# Altium footprint library UWRT Footprint Library.PcbLib: 258 footprints (part 13 of 17)
Each footprint in its own frame and in the unit in brackets; x right, y up, seen from the top. Pads: shape width x height; smd on the part's side, far side on the other; paste and mask are expansions set on the pad; w line width, h text height; cw(c..) or ccw(c..) is an arc to the next point about the centre after c.
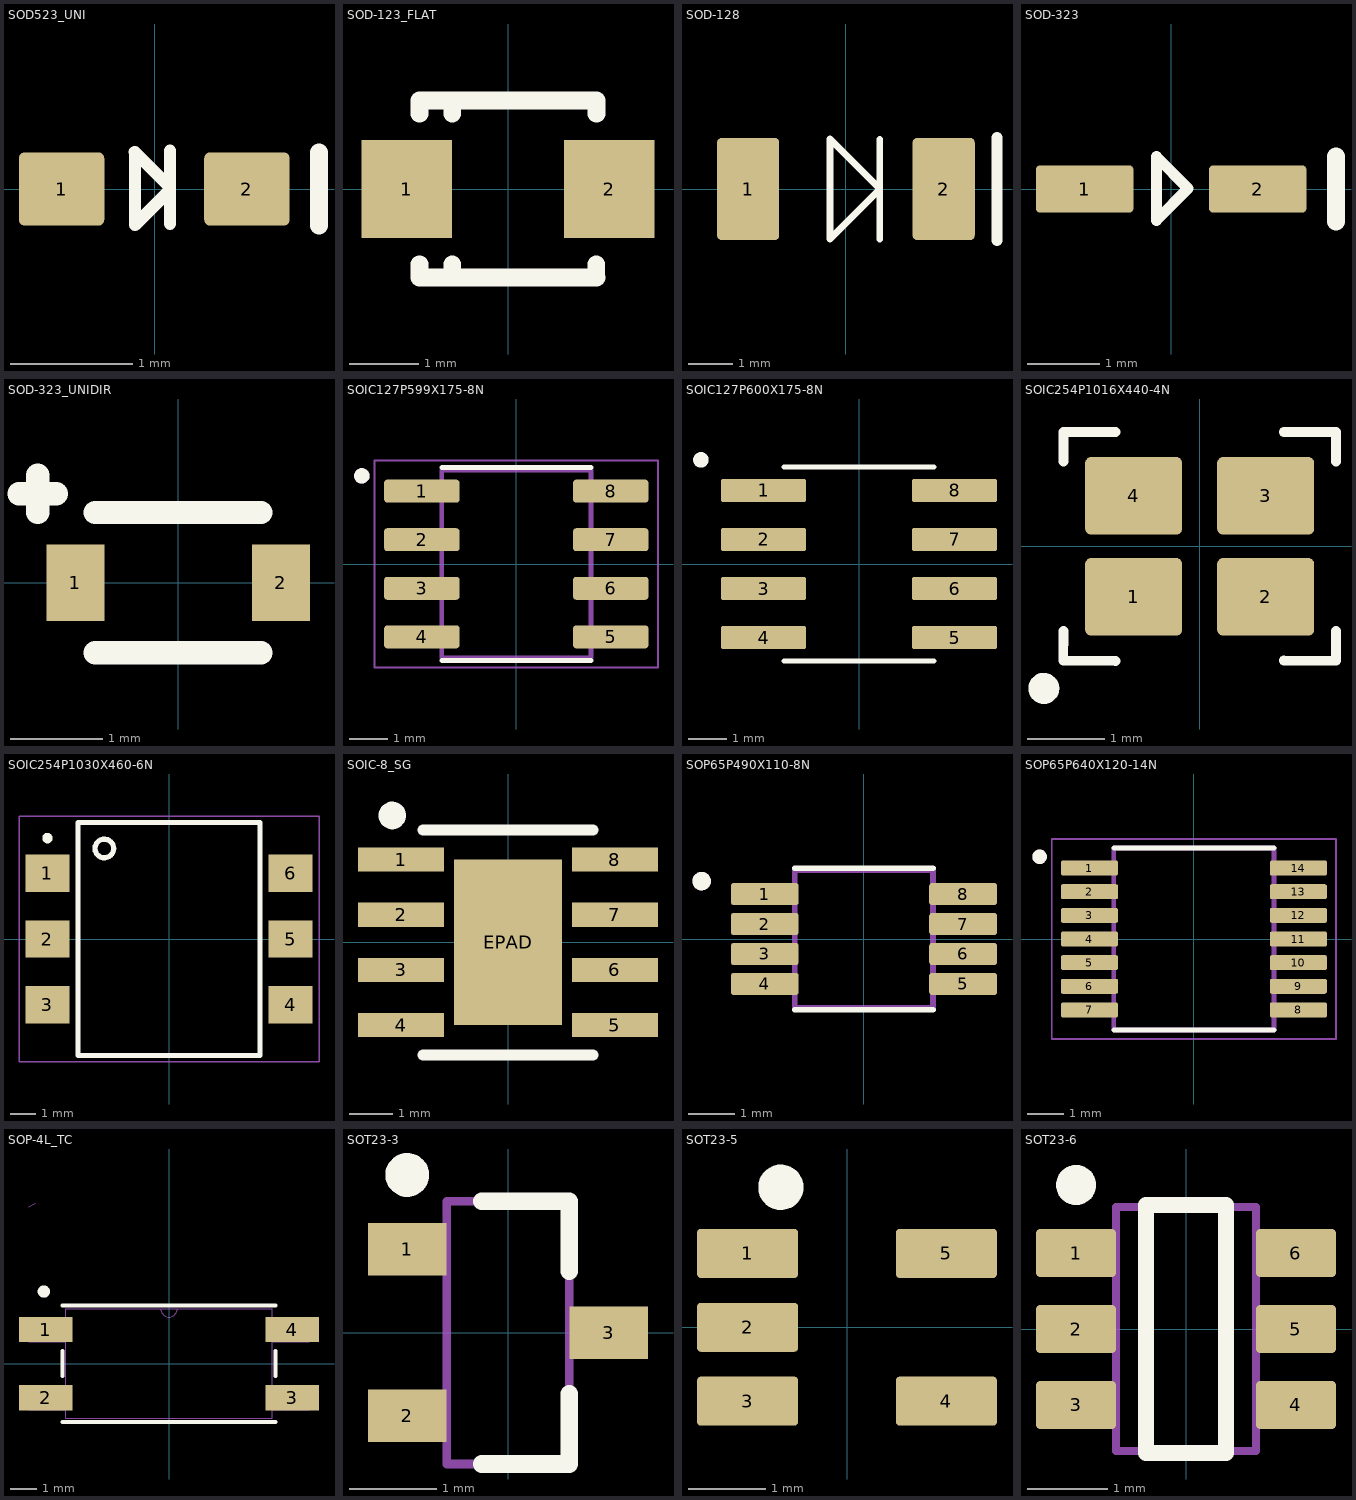
[diagram p12: the footprints below, top view; thin cyan lines are the x and y axes]

## SOD523_UNI [mm]
pads (2):
  rrect15% 0.7x0.6 smd: 1(-0.762,0) 2(0.758,0)
Top Overlay:
  lines w0.102: -0.162,0.303 0.125,0.016 ; -0.16,0.302 -0.16,-0.295 0.127,-0.008 ; 0.127,-0.284 0.127,0.313
  lines w0.15: 1.35,-0.3 1.35,0.3
3D body "User Library-SOD-523F.STEP": height 0.7, standoff 0, extent -0.8,-0.399 0.8,0.399

## SOD-123_FLAT [mm]
pads (2):
  rect 1.3x1.4 smd: 1(-1.45,0) 2(1.45,0)
Top Overlay:
  lines w0.254: -1.27,-1.27 1.27,-1.27 ; -1.27,1.077 -1.27,1.27 1.27,1.27 1.27,1.077 ; -1.268,-1.27 -1.268,-1.077 ; -0.8,-1.27 -0.8,-1.077 ; -0.8,1.077 -0.8,1.27 ; 1.266,-1.27 1.266,-1.077
Top Paste:
  rectangle: 0.8,-0.7 2.1,0.7
  rectangle: -2.1,-0.7 -0.8,0.7
3D body "SOD-123FL.STEP": height 1.35, standoff 0, extent -1.925,-1.077 1.925,1.076

## SOD-128 [mm]
pads (2):
  rrect15% 1.4x2.3 smd: 1(-2.2,0) 2(2.2,0)
Top Overlay:
  lines w0.152: -0.358,-1.124 -0.358,1.123 0.764,0.001 ; -0.358,-1.123 0.764,-0.001 ; 0.764,-1.125 0.764,1.122
  lines w0.254: 3.4,-1.15 3.4,1.15
3D body "DIO_RB050LAM_ROM-L.step": height 1.05, standoff 0, extent -2.426,-1.245 2.426,1.245

## SOD-323 [mm]
pads (2):
  rrect15% 1.35x0.65 smd: 1(-1.2,0) 2(1.2,0)
Top Overlay:
  lines w0.152: -0.205,0.45 -0.205,-0.434 0.236,0.007 -0.2,0.444
  lines w0.254: 2.286,-0.45 2.286,0.45
3D body "CMDSH05-4 TR--3DModel-STEP-56544.STEP": height 1.1, standoff 0.01, extent -1.245,-0.622 1.245,0.622

## SOD-323_UNIDIR [mm]
pads (2):
  rect 0.63x0.83 smd: 1(-1.115,0) 2(1.115,0)
Top Overlay:
  lines w0.254: -1.727,0.965 -1.321,0.965 ; -1.524,0.762 -1.524,1.168 ; -0.9,-0.762 0.9,-0.762 ; -0.9,0.762 0.9,0.762
3D body "CMDSH05-4 TR--3DModel-STEP-56544.STEP": height 1.1, standoff 0.01, extent -1.245,-0.622 1.245,0.622

## SOIC127P599X175-8N [mm]
pads (8):
  rrect25% 1.97x0.6 smd: 1(-2.47,1.905) 2(-2.47,0.635) 3(-2.47,-0.635) 4(-2.47,-1.905) 5(2.47,-1.905) 6(2.47,-0.635) 7(2.47,0.635) 8(2.47,1.905)
Top Overlay:
  circle w0.2: c-4.04,2.305 r0.1
  lines w0.127: -1.95,-2.525 1.95,-2.525 ; -1.95,2.525 1.95,2.525
Mechanical 13:
  circle w0.2: c-4.04,2.305 r0.1
  lines w0.127: -1.95,-2.452 -1.95,2.452 1.95,2.452 1.95,-2.452 -1.95,-2.452
Mechanical 15:
  lines w0.05: -3.705,-2.702 -3.705,2.702 3.705,2.702 3.705,-2.702 -3.705,-2.702
3D body "step_temp.STEP": height 1.75, standoff 0, extent -2.997,-2.451 2.997,2.451

## SOIC127P600X175-8N [mm]
pads (8):
  rrect15% 2.2x0.6 smd: 1(-2.475,1.905) 2(-2.475,0.635) 3(-2.475,-0.635) 4(-2.475,-1.905) 5(2.475,-1.905) 6(2.475,-0.635) 7(2.475,0.635) 8(2.475,1.905)
Top Overlay:
  circle w0.2: c-4.1,2.7 r0.1
  lines w0.127: -1.95,-2.51 1.95,-2.51 ; -1.95,2.51 1.95,2.51
3D body "MAX485CSA+T.STEP": height 1.75, standoff 0, extent -3,-2.45 3,2.45

## SOIC254P1016X440-4N [mm]
pads (4):
  rrect15% 1.25x1 smd: 1(-0.85,-0.65) 2(0.85,-0.65) 3(0.85,0.65) 4(-0.85,0.65)
Top Overlay:
  circle w0.2: c-2.007,-1.829 r0.1
  lines w0.127: -1.753,1.091 -1.753,1.472 -1.081,1.47 ; -1.751,-1.091 -1.755,-1.472 -1.083,-1.474 ; 1.083,-1.47 1.755,-1.472 1.755,-1.091 ; 1.083,1.474 1.755,1.472 1.755,1.091
3D body "SMD-4_2P5X2_AVX.step": height 0.56, standoff 0, extent -1.245,-0.851 1.245,0.851

## SOIC254P1030X460-6N [mm]
pads (6):
  rect 1.7x1.45 smd: 1(-4.7,2.54) 2(-4.7,0) 3(-4.7,-2.54) 4(4.7,-2.54) 5(4.7,0) 6(4.7,2.54)
Top Overlay:
  circle w0.2: c-2.5,3.5 r0.361
  circle w0.2: c-4.7,3.9 r0.1
  lines w0.2: -3.525,-4.5 3.525,-4.5 3.525,4.5 -3.525,4.5 -3.525,-4.5
Mechanical 16:
  lines w0.05: -5.8,-4.75 5.8,-4.75 5.8,4.75 -5.8,4.75 -5.8,-4.75
3D body "DIP6-OP7.STEP": height 4.1, standoff -0.27, extent -5.15,-4.3 5.15,4.3

## SOIC-8_SG [mil]
pads (9):
  rect 78x22 smd paste+0 mask+0: 1(-97,75) 2(-97,25) 3(-97,-25) 4(-97,-75) 5(97,-75) 6(97,-25) 7(97,25) 8(97,75)
  rect 98.03x150 smd paste-74.5 mask+0: EPAD(0,0)
Top Overlay:
  circle w15: c-105,115 r5
  lines w10: -77,-102 77,-102 ; -77,102 77,102
Top Paste:
  region: 45.08,71.06 -45.08,71.06 -45.08,28.94 45.08,28.94
  region: 45.08,21.06 -45.08,21.06 -45.08,-21.06 45.08,-21.06
  region: 45.08,-28.94 -45.08,-28.94 -45.08,-71.06 45.08,-71.06
3D body: height 10, standoff 0, extent 0,0 10,10
3D body "SOIC8_SG_4P9X3P9MC.step": height 69.02, standoff 0, extent -122,-96.49 122.01,96.5

## SOP65P490X110-8N [mm]
pads (8):
  rrect25% 1.47x0.48 smd: 1(-2.15,0.975) 2(-2.15,0.325) 3(-2.15,-0.325) 4(-2.15,-0.975) 5(2.15,-0.975) 6(2.15,-0.325) 7(2.15,0.325) 8(2.15,0.975)
Top Overlay:
  circle w0.2: c-3.52,1.255 r0.1
  lines w0.127: -1.5,-1.535 1.5,-1.535 ; -1.5,1.535 1.5,1.535
Mechanical 13:
  circle w0.2: c-3.52,1.255 r0.1
  lines w0.127: -1.5,-1.5 1.5,-1.5 1.5,1.5 -1.5,1.5 -1.5,-1.5
3D body "LM74610QDGKRQ1.STEP": height 1.1, standoff 0, extent -2.45,-1.5 2.45,1.5

## SOP65P640X120-14N [mm]
pads (14):
  rrect25% 1.57x0.41 smd: 1(-2.87,1.95) 2(-2.87,1.3) 3(-2.87,0.65) 4(-2.87,0) 5(-2.87,-0.65) 6(-2.87,-1.3) 7(-2.87,-1.95) 8(2.87,-1.95) 9(2.87,-1.3) 10(2.87,-0.65) 11(2.87,0) 12(2.87,0.65) 13(2.87,1.3) 14(2.87,1.95)
Top Overlay:
  circle w0.2: c-4.24,2.26 r0.1
  lines w0.127: -2.2,-2.5 2.2,-2.5 ; -2.2,2.5 2.2,2.5
Mechanical 13:
  circle w0.2: c-4.24,2.26 r0.1
  lines w0.127: -2.2,-2.5 2.2,-2.5 2.2,2.5 -2.2,2.5 -2.2,-2.5
Mechanical 15:
  lines w0.05: -3.905,-2.75 3.905,-2.75 3.905,2.75 -3.905,2.75 -3.905,-2.75
3D body "LSF0204QPWRQ1.STEP": height 1.2, standoff 0, extent -3.2,-2.5 3.2,2.5

## SOP-4L_TC [mil]
pads (4):
  rect 79x37 smd: 1(-181,50) 2(-181,-50) 3(181,-50) 4(181,50)
Top Overlay:
  circle w10: c-184,106 r4
  lines w6: -156.5,-85.5 156.5,-85.5 ; -156.5,-18.4 -156.5,18.4 ; -156.5,85.5 156.5,85.5 ; 156.5,-18.4 156.5,18.4
Mechanical 7:
  lines w1: -206.5,230.5 -196.5,235.5
Mechanical 13:
  lines w0: -12,80.5 ccw(c0,80.5) 12,80.5
  lines w1: -206.5,-67.5 -206.5,-32.5 -151.5,-32.5 -151.5,-67.5 -206.5,-67.5 ; -206.5,32.5 -206.5,67.5 -151.5,67.5 -151.5,32.5 -206.5,32.5 ; -151.5,-80.5 151.5,-80.5 151.5,80.5 -151.5,80.5 -151.5,-80.5 ; 151.5,-67.5 151.5,-32.5 206.5,-32.5 206.5,-67.5 151.5,-67.5 ; 151.5,32.5 151.5,67.5 206.5,67.5 206.5,32.5 151.5,32.5
3D body: height 10, standoff 0, extent 0,0 10,10
3D body "SOP-4L_TC.step": height 91.1, standoff 0, extent -206.49,-80.51 206.5,80.52

## SOT23-3 [mm] "SOT23, 3-Leads, Body 2.90x2.30mm, Pitch 0.95mm, IPC Medium Density"
height 1.1
pads (3):
  rect 0.9x0.6 smd: 1(-1.15,0.95) 2(-1.15,-0.95) 3(1.15,0)
Top Overlay:
  circle w0.25: c-1.15,1.8 r0.125
  lines w0.2: -0.3,-1.5 0.7,-1.5 0.7,-0.7 ; -0.3,1.5 0.7,1.5 0.7,0.7
Mechanical 13:
  lines w0.1: -0.7,-1.5 -0.7,1.5 0.7,1.5 0.7,-1.5 -0.7,-1.5
3D body "SOT95P230X110-3N.step": height 1.1, standoff 0, extent -1.3,-1.5 1.3,1.5

## SOT23-5 [mm]
pads (5):
  rrect15% 1.3x0.63 smd: 1(-1.279,0.95) 2(-1.279,0) 3(-1.279,-0.95) 4(1.279,-0.95) 5(1.279,0.95)
Top Overlay:
  circle w0.3: c-0.85,1.8 r0.141
3D body "SN74AHC1G02DBVT.stp": height 1.2, standoff 0, extent -1.4,-1.45 1.4,1.45

## SOT23-6 [mm] "SOT23, 6-Leads, Body 3.05x1.75mm, Pitch 0.95mm, IPC Medium Density"
height 1.1
pads (6):
  rrect17% 1x0.6 smd: 1(-1.375,0.95) 2(-1.375,0) 3(-1.375,-0.95) 4(1.375,-0.95) 5(1.375,0) 6(1.375,0.95)
Top Overlay:
  circle w0.25: c-1.375,1.8 r0.125
  lines w0.2: -0.5,-1.55 -0.5,1.55 0.5,1.55 0.5,-1.55 -0.5,-1.55
Mechanical 13:
  lines w0.1: -0.875,-1.525 0.875,-1.525 0.875,1.525 -0.875,1.525 -0.875,-1.525
3D body "DDC0006A.stp": height 0.9, standoff -0.02, extent -1.434,-1.485 1.434,1.485